# Altium footprint library mastermind.PCBLIB: 1061 footprints (part 62 of 67)
Each footprint in its own frame and in the unit in brackets; x right, y up, seen from the top. Pads: shape width x height; smd on the part's side, far side on the other; paste and mask are expansions set on the pad; w line width, h text height; cw(c..) or ccw(c..) is an arc to the next point about the centre after c.
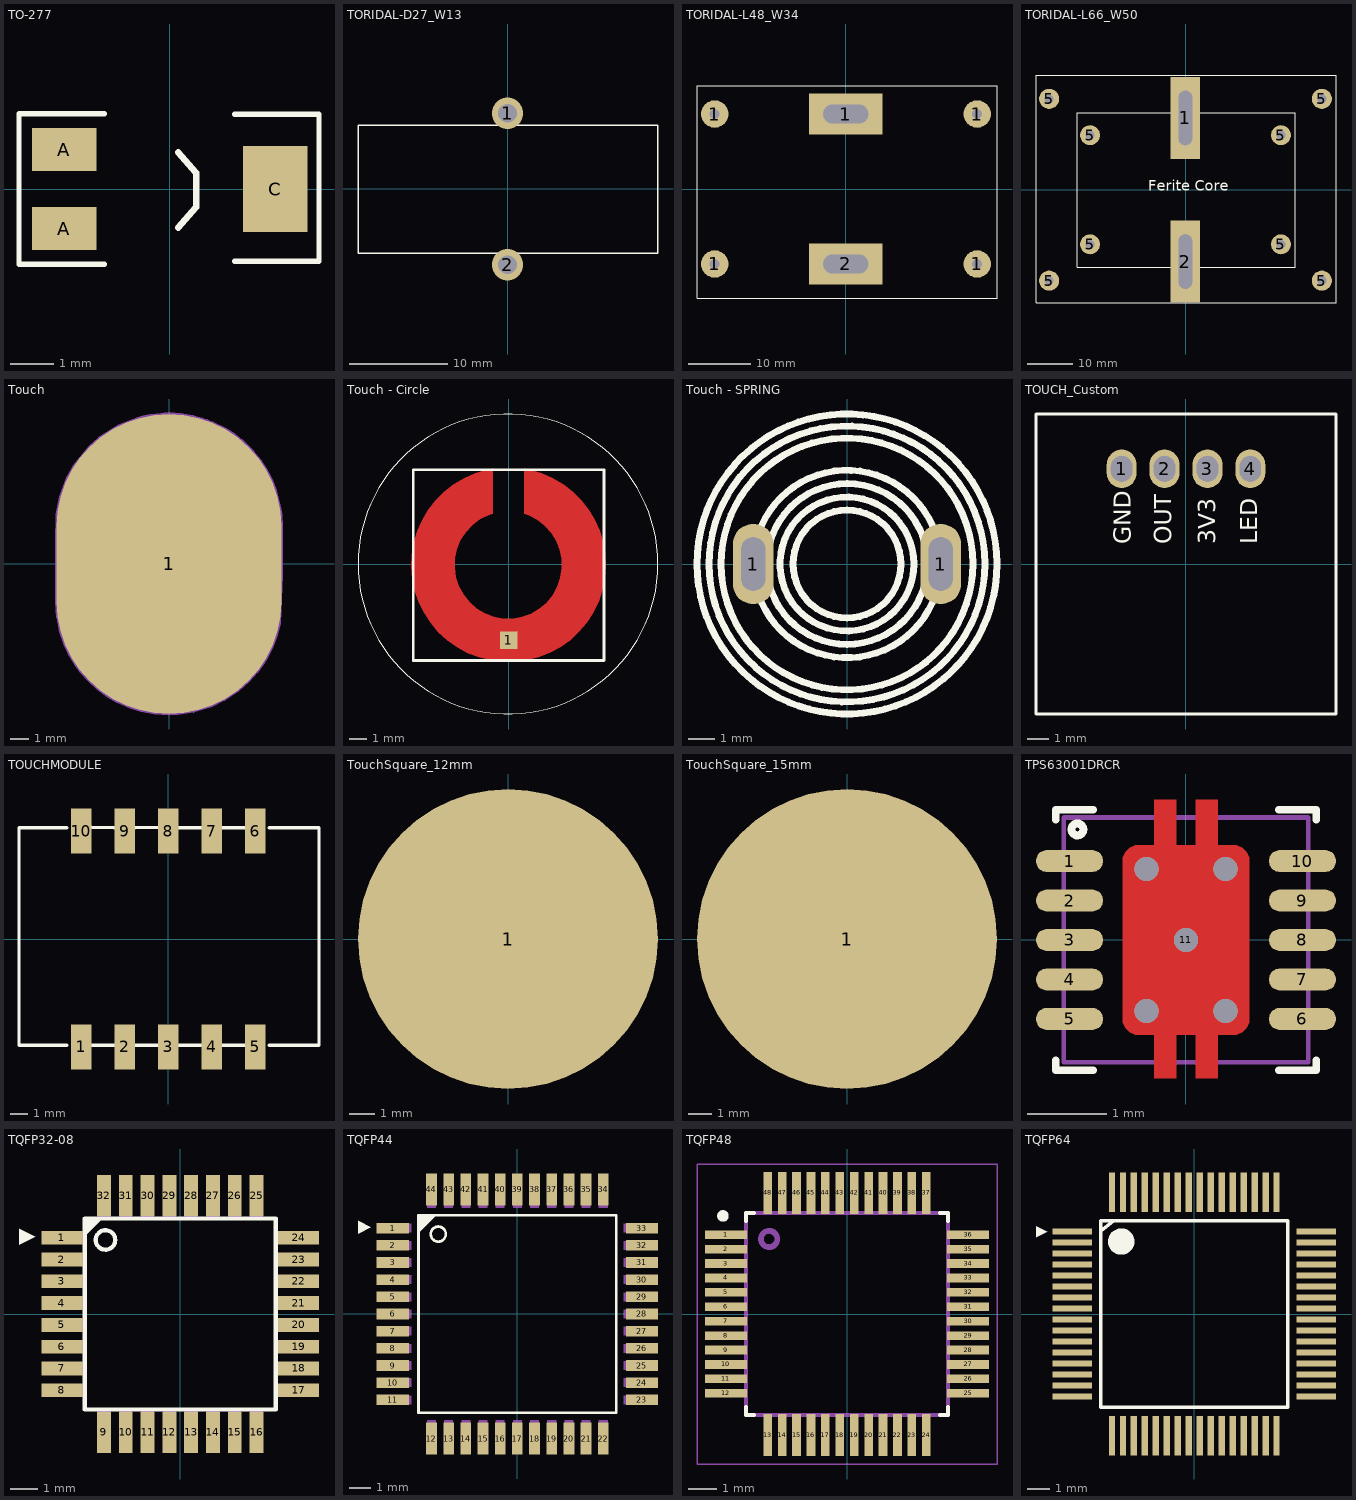
[diagram p61: the footprints below, top view; thin cyan lines are the x and y axes]

## TO-277 [mm]
pads (3):
  rect 1.5x1 smd: A(-2.45,-0.92) A(-2.45,0.92)
  rect 1.5x2 smd: C(2.45,0)
Top Overlay:
  lines w0.127: -1.519,-1.75 -3.505,-1.75 -3.505,1.754 -1.519,1.754 ; 1.506,-1.68 3.467,-1.68 3.467,1.744 1.506,1.744
  lines w0.152: 0.192,-0.895 0.61,-0.417 0.61,0.381 0.192,0.858
3D body "User Library-S1G-1.step": height 2.7, standoff 0, extent -2.787,-1.475 2.813,1.475

## TORIDAL-D27_W13 [mm]
pads (2):
  round 3.2 hole 1.9: 1(0,7.7) 2(0,-7.7)
Top Overlay:
  lines w0.152: -15.2,-6.52 15.3,-6.52 15.3,6.48 -15.2,6.48 -15.2,-6.52
3D body "Ind500uH (1).stp": height 31.61, standoff -2.62, extent -15.412,-8.52 15.412,8.52

## TORIDAL-L48_W34 [mm]
pads (6):
  round 4.4 hole 1.6: 1(-21,-12) 1(-21,12) 1(21,-12) 1(21,12)
  rect 11.8x6.5 hole 3 slot 7.2 at 0 deg: 1(-0.038,12) 2(-0.038,-12)
Top Overlay:
  lines w0.127: -23.838,-17.507 -23.838,16.493 24.162,16.493 24.162,-17.507 -23.838,-17.507
3D body "5Kw_INVI Toridal.STEP": height 8, standoff -66, extent -28.857,-18.237 31.143,16.763

## TORIDAL-L66_W50 [mm]
pads (10):
  rect 6.5x18 hole 3 slot 12 at 90 deg: 1(-0.038,15.8) 2(-0.038,-15.8)
  round 4.4 hole 2: 5(-30,-20) 5(-30,20) 5(-21,-12) 5(-21,12) 5(21,-12) 5(21,12) 5(30,-20) 5(30,20)
Top Overlay:
  lines w0.127: -32.89,-24.834 33.11,-24.834 33.11,25.166 -32.89,25.166 -32.89,-24.834 ; -23.838,-17.007 24.162,-17.007 24.162,16.993 -23.838,16.993 -23.838,-17.007
  text "Ferite Core" at -8.25,-0.956 h4
3D body "5Kw_INVI Toridal.STEP": height 68, standoff -6, extent -29.746,-17.246 30.254,17.754

## Touch [mm]
pads (1):
  oval 12x16 smd mask+902: 1(0,0)
Mechanical 1:
  lines w0.152: -6,-2 -6,-1.223 -6,0 -6,1.127 -5.966,2.64 -5.791,3.572 -5.383,4.651 -5.052,5.237 -4.243,6.243 -3.73,6.7 -2.672,7.372 -1.649,7.769 -1.405,7.833 -1.017,7.913 -0.659,7.964 -0.253,7.995 0.292,7.993 0.638,7.966 0.925,7.928 1.295,7.859 1.731,7.745 2.029,7.646 2.311,7.537 3.025,7.182 3.49,6.881 3.878,6.578 4.484,5.987 4.871,5.503 5.141,5.094 5.447,4.515 5.69,3.903 5.91,3.036 5.966,2.639 6,2 6,0.648 6,-0.584 5.886,-3.162 5.845,-3.354 5.711,-3.84 5.525,-4.341 5.232,-4.937 5.026,-5.278 4.672,-5.764 4.243,-6.243 3.709,-6.717 2.956,-7.221 2.216,-7.576 1.3,-7.857 0.487,-7.98 0,-8 -0.769,-7.951 -1.475,-7.816 -2.081,-7.627 -2.744,-7.336 -3.251,-7.043 -3.78,-6.66 -4.243,-6.243 -4.728,-5.694 -4.995,-5.324 -5.336,-4.744 -5.546,-4.288 -5.785,-3.593 -5.939,-2.857 -6,-2

## Touch - Circle [mm]
pads (1):
  rect 1x1 smd: 1(0,-4.4)
Top Layer:
  region: 0.901,5.487 1.244,5.431 1.912,5.235 2.55,4.958 3.149,4.604 3.699,4.178 4.193,3.688 4.622,3.141 4.98,2.544 5.262,1.908 5.463,1.242 5.579,0.556 5.61,-0.139 5.555,-0.833 5.414,-1.514 5.19,-2.173 4.886,-2.799 4.507,-3.382 4.058,-3.914 3.548,-4.387 2.982,-4.793 2.371,-5.125 1.724,-5.38 1.05,-5.552 0.359,-5.639 -0.336,-5.641 -1.027,-5.556 -1.702,-5.386 -2.35,-5.135 -2.963,-4.805 -3.53,-4.401 -4.042,-3.931 -4.493,-3.401 -4.874,-2.819 -5.181,-2.194 -5.408,-1.536 -5.551,-0.855 -5.609,-0.162 -5.581,0.533 -5.468,1.219 -5.27,1.886 -4.991,2.524 -4.635,3.122 -4.208,3.671 -3.716,4.163 -3.168,4.591 -2.57,4.948 -1.933,5.227 -1.266,5.426 -0.923,5.483 -0.919,2.91 -1.178,2.819 -1.669,2.569 -2.107,2.236 -2.48,1.831 -2.775,1.367 -2.984,0.858 -3.099,0.32 -3.117,-0.23 -3.037,-0.775 -2.863,-1.297 -2.599,-1.78 -2.254,-2.208 -1.839,-2.569 -1.366,-2.851 -0.851,-3.044 -0.309,-3.144 0.241,-3.146 0.783,-3.051 1.3,-2.862 1.775,-2.584 2.193,-2.227 2.542,-1.801 2.81,-1.32 2.988,-0.8 3.072,-0.256 3.058,0.294 2.948,0.833 2.743,1.344 2.452,1.811 2.083,2.219 1.647,2.555 1.159,2.809 0.9,2.903
Top Overlay:
  circle w0.04: c-0.034,0 r8.65
  lines w0.152: -5.499,-5.566 5.501,-5.566 5.501,5.434 -5.499,5.434 -5.499,-5.566
Top Solder:
  region: 0.901,5.468 1.244,5.412 1.912,5.216 2.55,4.939 3.149,4.585 3.699,4.159 4.193,3.669 4.622,3.121 4.98,2.525 5.262,1.888 5.463,1.222 5.579,0.536 5.61,-0.159 5.555,-0.852 5.414,-1.534 5.19,-2.192 4.886,-2.818 4.507,-3.402 4.058,-3.934 3.548,-4.406 2.982,-4.812 2.371,-5.144 1.724,-5.399 1.05,-5.571 0.359,-5.659 -0.336,-5.66 -1.027,-5.575 -1.702,-5.406 -2.35,-5.154 -2.963,-4.824 -3.53,-4.421 -4.042,-3.95 -4.493,-3.42 -4.874,-2.838 -5.181,-2.213 -5.408,-1.556 -5.551,-0.875 -5.609,-0.181 -5.581,0.514 -5.468,1.2 -5.27,1.867 -4.991,2.505 -4.635,3.103 -4.208,3.652 -3.716,4.144 -3.168,4.572 -2.57,4.928 -1.933,5.208 -1.266,5.407 -0.923,5.464 -0.919,2.891 -1.178,2.799 -1.669,2.55 -2.107,2.217 -2.48,1.812 -2.775,1.348 -2.984,0.838 -3.099,0.3 -3.117,-0.25 -3.037,-0.794 -2.863,-1.316 -2.599,-1.799 -2.254,-2.228 -1.839,-2.588 -1.366,-2.87 -0.851,-3.064 -0.309,-3.163 0.241,-3.166 0.783,-3.071 1.3,-2.881 1.775,-2.603 2.193,-2.246 2.542,-1.82 2.81,-1.339 2.988,-0.819 3.072,-0.275 3.058,0.275 2.948,0.814 2.743,1.325 2.452,1.792 2.083,2.2 1.647,2.536 1.159,2.79 0.9,2.883
Multi-Layer:
  pour cut-out: -0.034,-8.65 -0.459,-8.65 -1.305,-8.567 -2.139,-8.401 -2.952,-8.154 -3.737,-7.829 -4.487,-7.428 -5.193,-6.956 -5.85,-6.417 -6.451,-5.816 -6.99,-5.159 -7.463,-4.452 -7.863,-3.703 -8.188,-2.918 -8.435,-2.104 -8.601,-1.271 -8.684,-0.425 -8.684,0 -8.684,0.425 -8.601,1.271 -8.435,2.104 -8.188,2.918 -7.863,3.703 -7.463,4.452 -6.99,5.159 -6.451,5.816 -5.85,6.417 -5.193,6.956 -4.487,7.428 -3.737,7.829 -2.952,8.154 -2.139,8.401 -1.305,8.567 -0.459,8.65 -0.034,8.65 0.391,8.65 1.236,8.567 2.07,8.401 2.883,8.154 3.668,7.829 4.418,7.428 5.125,6.956 5.782,6.417 6.383,5.816 6.922,5.159 7.394,4.452 7.795,3.703 8.12,2.918 8.367,2.104 8.532,1.271 8.616,0.425 8.616,0 8.616,-0.425 8.532,-1.271 8.367,-2.104 8.12,-2.918 7.795,-3.703 7.394,-4.452 6.922,-5.159 6.383,-5.816 5.782,-6.417 5.125,-6.956 4.418,-7.428 3.668,-7.829 2.883,-8.154 2.07,-8.401 1.236,-8.567 0.391,-8.65

## Touch - SPRING [mm]
pads (2):
  oval 1.524x3 hole 0.9 slot 2 at 90 deg: 1(-3.5,0) 1(3.5,0)
Top Overlay:
  circle w0.254: c0,0 r2.014
  circle w0.254: c0,0 r2.5
  lines w0.254: -3.194,1.43 cw(c0,0) 3.195,1.429 ; -3.193,-1.434 ccw(c0,0) 3.192,-1.435 ; -2.897,-0.781 ccw(c0,0) 2.897,-0.781 ; -2.884,0.781 cw(c0.013,0) 2.909,0.781 ; 4.7,0 cw(c0,0) 4.7,0.012 ; 5.15,0 cw(c0,0) 5.15,0.013 ; 5.6,0 cw(c0,0) 5.6,0.014

## TOUCH_Custom [mm]
pads (4):
  oval 1.4x1.8 / inner oval 1.4x1.8 / far side oval 1.6x2 hole 1.2 slot 1 at 0 deg: 1(-3,4.442) 2(-1,4.442) 3(1,4.442) 4(3,4.442)
Top Overlay:
  lines w0.127: -7,-7 -7,7 7,7 7,-7 -7,-7
  text "GND" at -2.582,0.926 h0.8
  text "OUT" at -0.697,0.926 h0.8
  text "3V3" at 1.363,0.926 h0.8
  text "LED" at 3.324,0.926 h0.8
3D body: height 3, standoff 0, extent -7,-7 7,7

## TOUCHMODULE [mm]
pads (10):
  rect 1.2x2.6 smd: 1(-5.08,-6.3) 2(-2.54,-6.3) 3(0,-6.3) 4(2.54,-6.3) 5(5.08,-6.3) 6(5.08,6.3) 7(2.54,6.3) 8(0,6.3) 9(-2.54,6.3) 10(-5.08,6.3)
Top Overlay:
  lines w0.203: -8.7,-6.2 -8.7,6.5 ; -8.64,-6.2 -5.9,-6.2 ; -8.64,6.5 -5.9,6.5 ; -4.48,-6.2 -3.14,-6.2 ; -4.48,6.521 -3.14,6.503 ; -1.94,-6.2 -0.6,-6.2 ; -1.94,6.495 -0.6,6.505 ; 0.6,-6.2 1.94,-6.2 ; 0.6,6.497 1.94,6.5 ; 3.14,-6.2 4.48,-6.2 ; 3.14,6.48 4.48,6.487 ; 5.9,-6.2 8.76,-6.2 ; 5.9,6.5 8.76,6.5 ; 8.8,-6.2 8.8,6.5

## TouchSquare_12mm [mm]
pads (1):
  round 12 smd mask+902: 1(0,0)

## TouchSquare_15mm [mm]
pads (1):
  round 13 smd mask+902: 1(0,0)

## TPS63001DRCR [mm]
pads (11):
  oval 0.85x0.28 smd: 1(-1.475,1) 2(-1.475,0.5) 3(-1.475,0) 4(-1.475,-0.5) 5(-1.475,-1) 6(1.475,-1) 7(1.475,-0.5) 8(1.475,0) 9(1.475,0.5) 10(1.475,1)
  round 0.2 smd: 11(0,0)
via 0,0 diameter 0.3 hole 0.3
via 0.5,0.9 diameter 0.3 hole 0.3
via -0.5,0.9 diameter 0.3 hole 0.3
via -0.5,-0.9 diameter 0.3 hole 0.3
via 0.5,-0.9 diameter 0.3 hole 0.3
Top Layer:
  region: -0.8,1 -0.8,-1 -0.8,-1.04 -0.77,-1.113 -0.713,-1.17 -0.64,-1.2 -0.6,-1.2 0.6,-1.2 0.64,-1.2 0.713,-1.17 0.77,-1.113 0.8,-1.04 0.8,-1 0.8,1 0.8,1.04 0.769,1.113 0.713,1.169 0.64,1.2 0.6,1.2 -0.6,1.2 -0.64,1.2 -0.713,1.17 -0.77,1.113 -0.8,1.04
  region: -0.4,1.775 -0.125,1.775 -0.125,1.2 -0.4,1.2
  region: 0.125,1.775 0.4,1.775 0.4,1.2 0.125,1.2
  region: -0.4,-1.2 -0.125,-1.2 -0.125,-1.75 -0.4,-1.75
  region: 0.125,-1.2 0.4,-1.2 0.4,-1.75 0.125,-1.75
Top Overlay:
  circle w0.1: c-1.375,1.4 r0.075
  lines w0.1: -1.65,-1.525 -1.65,-1.65 -1.175,-1.65 ; -1.65,1.525 -1.65,1.65 -1.175,1.65 ; 1.175,-1.65 1.65,-1.65 1.65,-1.525 ; 1.175,1.65 1.65,1.65 1.65,1.525
Top Solder:
  region: -0.813,1 -0.813,-1 -0.813,-1.04 -0.782,-1.113 -0.726,-1.169 -0.652,-1.2 -0.613,-1.2 0.587,-1.2 0.627,-1.2 0.701,-1.17 0.757,-1.113 0.787,-1.04 0.787,-1 0.787,1 0.787,1.04 0.757,1.113 0.701,1.17 0.627,1.2 0.587,1.2 -0.613,1.2 -0.652,1.2 -0.726,1.17 -0.782,1.113 -0.813,1.04
  region: -0.4,1.775 -0.125,1.775 -0.125,1.2 -0.4,1.2
  region: 0.125,1.775 0.4,1.775 0.4,1.2 0.125,1.2
  region: -0.4,-1.2 -0.125,-1.2 -0.125,-1.75 -0.4,-1.75
  region: 0.125,-1.2 0.4,-1.2 0.4,-1.75 0.125,-1.75
Mechanical 13:
  lines w0.06: -1.55,-1.55 1.55,-1.55 1.55,1.55 -1.55,1.55 -1.55,-1.55

## TQFP32-08 [mm]
pads (32):
  rect 1.5x0.508 smd: 1(-4.343,2.8) 2(-4.343,2) 3(-4.343,1.2) 4(-4.343,0.4) 5(-4.343,-0.4) 6(-4.343,-1.2) 7(-4.343,-2) 8(-4.343,-2.8) 17(4.343,-2.8) 18(4.343,-2) 19(4.343,-1.2) 20(4.343,-0.4) 21(4.343,0.4) 22(4.343,1.2) 23(4.343,2) 24(4.343,2.8)
  rect 0.508x1.5 smd: 9(-2.8,-4.343) 10(-2,-4.343) 11(-1.2,-4.343) 12(-0.4,-4.343) 13(0.4,-4.343) 14(1.2,-4.343) 15(2,-4.343) 16(2.8,-4.343) 25(2.8,4.343) 26(2,4.343) 27(1.2,4.343) 28(0.4,4.343) 29(-0.4,4.343) 30(-1.2,4.343) 31(-2,4.343) 32(-2.8,4.343)
Top Overlay:
  circle w0.152: c-2.743,2.718 r0.359
  region: -3.556,2.8 -2.8,3.556 -3.454,3.556 -3.556,3.454
  region: -5.918,3.131 -5.918,2.534 -5.321,2.832
  lines w0.152: -3.505,-3.505 3.505,-3.505 3.505,3.505 -3.505,3.505 -3.505,-3.505
Mechanical 8:
  region: -4.547,2.571 -4.547,3.029 -3.556,3.029 -3.556,2.571
  region: -4.547,1.771 -4.547,2.229 -3.556,2.229 -3.556,1.771
  region: -4.547,0.971 -4.547,1.428 -3.556,1.428 -3.556,0.971
  region: -4.547,0.171 -4.547,0.629 -3.556,0.629 -3.556,0.171
  region: -4.547,-0.629 -4.547,-0.171 -3.556,-0.171 -3.556,-0.629
  region: -4.547,-1.428 -4.547,-0.971 -3.556,-0.971 -3.556,-1.428
  region: -4.547,-2.229 -4.547,-1.771 -3.556,-1.771 -3.556,-2.229
  region: -4.547,-3.029 -4.547,-2.571 -3.556,-2.571 -3.556,-3.029
  region: -3.029,-4.547 -3.029,-3.556 -2.571,-3.556 -2.571,-4.547
  region: -2.229,-4.547 -2.229,-3.556 -1.771,-3.556 -1.771,-4.547
  region: -1.428,-4.547 -1.428,-3.556 -0.971,-3.556 -0.971,-4.547
  region: -0.629,-4.547 -0.629,-3.556 -0.171,-3.556 -0.171,-4.547
  region: 0.171,-4.547 0.171,-3.556 0.629,-3.556 0.629,-4.547
  region: 0.971,-4.547 0.971,-3.556 1.428,-3.556 1.428,-4.547
  region: 1.771,-4.547 1.771,-3.556 2.229,-3.556 2.229,-4.547
  region: 2.571,-4.547 2.571,-3.556 3.029,-3.556 3.029,-4.547
  region: 3.556,-3.029 3.556,-2.571 4.547,-2.571 4.547,-3.029
  region: 3.556,-2.229 3.556,-1.771 4.547,-1.771 4.547,-2.229
  region: 3.556,-1.428 3.556,-0.971 4.547,-0.971 4.547,-1.428
  region: 3.556,-0.629 3.556,-0.171 4.547,-0.171 4.547,-0.629
  region: 3.556,0.171 3.556,0.629 4.547,0.629 4.547,0.171
  region: 3.556,0.971 3.556,1.428 4.547,1.428 4.547,0.971
  region: 3.556,1.771 3.556,2.229 4.547,2.229 4.547,1.771
  region: 3.556,2.571 3.556,3.029 4.547,3.029 4.547,2.571
  region: 2.571,3.556 2.571,4.547 3.029,4.547 3.029,3.556
  region: 1.771,3.556 1.771,4.547 2.229,4.547 2.229,3.556
  region: 0.971,3.556 0.971,4.547 1.428,4.547 1.428,3.556
  region: 0.171,3.556 0.171,4.547 0.629,4.547 0.629,3.556
  region: -0.629,3.556 -0.629,4.547 -0.171,4.547 -0.171,3.556
  region: -1.428,3.556 -1.428,4.547 -0.971,4.547 -0.971,3.556
  region: -2.229,3.556 -2.229,4.547 -1.771,4.547 -1.771,3.556
  region: -3.029,3.556 -3.029,4.547 -2.571,4.547 -2.571,3.556
3D body "User Library-TQFP-32.STEP": height 1.46, standoff 0, extent -4.5,-4.5 4.5,4.5

## TQFP44 [mm]
pads (44):
  rect 1.5x0.5 smd: 1(-5.8,4) 2(-5.8,3.2) 3(-5.8,2.4) 4(-5.8,1.6) 5(-5.8,0.8) 6(-5.8,0) 7(-5.8,-0.8) 8(-5.8,-1.6) 9(-5.8,-2.4) 10(-5.8,-3.2) 11(-5.8,-4) 23(5.8,-4) 24(5.8,-3.2) 25(5.8,-2.4) 26(5.8,-1.6) 27(5.8,-0.8) 28(5.8,0) 29(5.8,0.8) 30(5.8,1.6) 31(5.8,2.4) 32(5.8,3.2) 33(5.8,4)
  rect 0.5x1.5 smd: 12(-4,-5.8) 13(-3.2,-5.8) 14(-2.4,-5.8) 15(-1.6,-5.8) 16(-0.8,-5.8) 17(0,-5.8) 18(0.8,-5.8) 19(1.6,-5.8) 20(2.4,-5.8) 21(3.2,-5.8) 22(4,-5.8) 34(4,5.8) 35(3.2,5.8) 36(2.4,5.8) 37(1.6,5.8) 38(0.8,5.8) 39(0,5.8) 40(-0.8,5.8) 41(-1.6,5.8) 42(-2.4,5.8) 43(-3.2,5.8) 44(-4,5.8)
Top Overlay:
  region: -4.569,3.813 -3.813,4.569 -4.569,4.569
  region: -7.423,4.34 -7.423,3.743 -6.826,4.042
  lines w0.127: -4.6,-4.6 -4.6,4.6 ; -4.585,-4.6 4.6,-4.6 4.6,4.6 -4.585,4.6 ; -3.333,3.73 ccw(c-3.683,3.721) -3.333,3.721
Mechanical 8:
  drawing of 44 lines, arcs and shapes, not listed
3D body "Atmega32u4 v4.step": height 1.05, standoff -0.06, extent -6.009,-6.013 5.991,5.987

## TQFP48 [mm]
pads (48):
  rect 1.45x0.3 smd: 1(-4.2,2.75) 2(-4.2,2.25) 3(-4.2,1.75) 4(-4.2,1.25) 5(-4.2,0.75) 6(-4.2,0.25) 7(-4.2,-0.25) 8(-4.2,-0.75) 9(-4.2,-1.25) 10(-4.2,-1.75) 11(-4.2,-2.25) 12(-4.2,-2.75) 25(4.2,-2.75) 26(4.2,-2.25) 27(4.2,-1.75) 28(4.2,-1.25) 29(4.2,-0.75) 30(4.2,-0.25) 31(4.2,0.25) 32(4.2,0.75) 33(4.2,1.25) 34(4.2,1.75) 35(4.2,2.25) 36(4.2,2.75)
  rect 0.3x1.45 smd: 13(-2.75,-4.2) 14(-2.25,-4.2) 15(-1.75,-4.2) 16(-1.25,-4.2) 17(-0.75,-4.2) 18(-0.25,-4.2) 19(0.25,-4.2) 20(0.75,-4.2) 21(1.25,-4.2) 22(1.75,-4.2) 23(2.25,-4.2) 24(2.75,-4.2) 37(2.75,4.2) 38(2.25,4.2) 39(1.75,4.2) 40(1.25,4.2) 41(0.75,4.2) 42(0.25,4.2) 43(-0.25,4.2) 44(-0.75,4.2) 45(-1.25,4.2) 46(-1.75,4.2) 47(-2.25,4.2) 48(-2.75,4.2)
Top Overlay:
  circle w0.2: c-4.3,3.4 r0.1
  lines w0.127: -3.5,-3.21 -3.5,-3.5 -3.21,-3.5 ; -3.5,3.21 -3.5,3.5 -3.21,3.5 ; 3.21,-3.5 3.5,-3.5 3.5,-3.21 ; 3.21,3.5 3.5,3.5 3.5,3.21
Mechanical 13:
  circle w0.2: c-2.7,2.6 r0.283
  lines w0.127: -3.5,-3.5 3.5,-3.5 3.5,3.5 -3.5,3.5 -3.5,-3.5
Mechanical 15:
  lines w0.05: -5.2,-5.2 5.2,-5.2 5.2,5.2 -5.2,5.2 -5.2,-5.2
3D body "User Library-TQFP-48.STEP": height 1.45, standoff -0.01, extent -4.5,-4.5 4.5,4.5

## TQFP64 [mm]
pads (64):
  rect 1.8x0.28 smd: 1(-5.55,3.75) 2(-5.55,3.25) 3(-5.55,2.75) 4(-5.55,2.25) 5(-5.55,1.75) 6(-5.55,1.25) 7(-5.55,0.75) 8(-5.55,0.25) 9(-5.55,-0.25) 10(-5.55,-0.75) 11(-5.55,-1.25) 12(-5.55,-1.75) 13(-5.55,-2.25) 14(-5.55,-2.75) 15(-5.55,-3.25) 16(-5.55,-3.75) 33(5.55,-3.75) 34(5.55,-3.25) 35(5.55,-2.75) 36(5.55,-2.25) 37(5.55,-1.75) 38(5.55,-1.25) 39(5.55,-0.75) 40(5.55,-0.25) 41(5.55,0.25) 42(5.55,0.75) 43(5.55,1.25) 44(5.55,1.75) 45(5.55,2.25) 46(5.55,2.75) 47(5.55,3.25) 48(5.55,3.75)
  rect 0.28x1.8 smd: 17(-3.75,-5.55) 18(-3.25,-5.55) 19(-2.75,-5.55) 20(-2.25,-5.55) 21(-1.75,-5.55) 22(-1.25,-5.55) 23(-0.75,-5.55) 24(-0.25,-5.55) 25(0.25,-5.55) 26(0.75,-5.55) 27(1.25,-5.55) 28(1.75,-5.55) 29(2.25,-5.55) 30(2.75,-5.55) 31(3.25,-5.55) 32(3.75,-5.55) 49(3.75,5.55) 50(3.25,5.55) 51(2.75,5.55) 52(2.25,5.55) 53(1.75,5.55) 54(1.25,5.55) 55(0.75,5.55) 56(0.25,5.55) 57(-0.25,5.55) 58(-0.75,5.55) 59(-1.25,5.55) 60(-1.75,5.55) 61(-2.25,5.55) 62(-2.75,5.55) 63(-3.25,5.55) 64(-3.75,5.55)
Top Overlay:
  region: -7.201,4.001 -7.201,3.492 -6.693,3.746
  lines w0.152: -4.249,3.779 -3.651,4.249 ; -4.249,-4.249 -4.249,4.249 4.249,4.249 4.249,-4.249 -4.249,-4.249
  lines w0.6: -3.025,3.294 cw(c-3.325,3.297) -3.025,3.299
3D body "User Library-S-PQFP-G64.step": height 1, standoff 0, extent -5.791,-5.787 5.79,5.788